# Altium footprint library KwantLib.PcbLib: 249 footprints (part 9 of 16)
Each footprint in its own frame and in the unit in brackets; x right, y up, seen from the top. Pads: shape width x height; smd on the part's side, far side on the other; paste and mask are expansions set on the pad; w line width, h text height; cw(c..) or ccw(c..) is an arc to the next point about the centre after c.
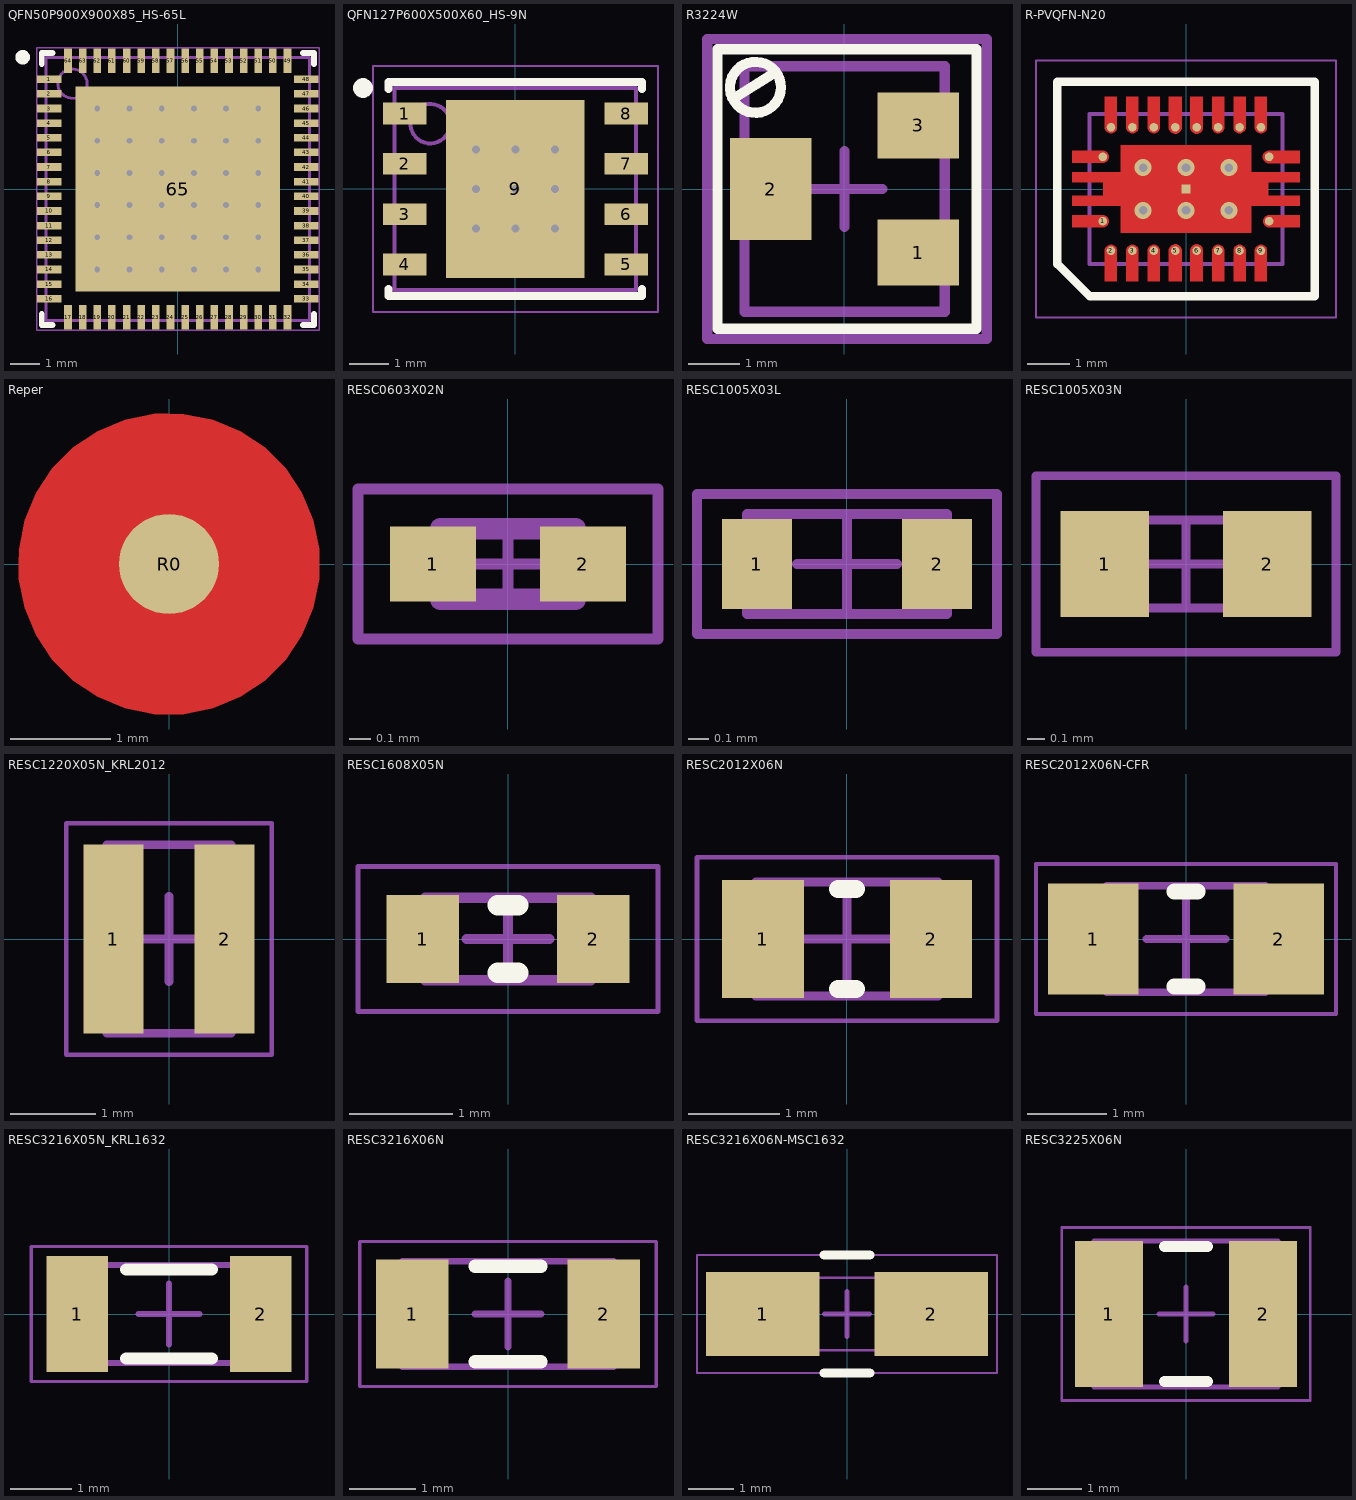
[diagram p8: the footprints below, top view; thin cyan lines are the x and y axes]

## QFN50P900X900X85_HS-65L [mm] "QFN, 64-Leads, Body 9.00x9.00mm, Pitch 0.50mm, Thermal Pad 6.90x6.90mm, IPC High Density"
height 0.85
pads (65):
  rect 0.84x0.26 smd mask+0.07: 1(-4.385,3.75) 2(-4.385,3.25) 3(-4.385,2.75) 4(-4.385,2.25) 5(-4.385,1.75) 6(-4.385,1.25) 7(-4.385,0.75) 8(-4.385,0.25) 9(-4.385,-0.25) 10(-4.385,-0.75) 11(-4.385,-1.25) 12(-4.385,-1.75) 13(-4.385,-2.25) 14(-4.385,-2.75) 15(-4.385,-3.25) 16(-4.385,-3.75) 33(4.385,-3.75) 34(4.385,-3.25) 35(4.385,-2.75) 36(4.385,-2.25) 37(4.385,-1.75) 38(4.385,-1.25) 39(4.385,-0.75) 40(4.385,-0.25) 41(4.385,0.25) 42(4.385,0.75) 43(4.385,1.25) 44(4.385,1.75) 45(4.385,2.25) 46(4.385,2.75) 47(4.385,3.25) 48(4.385,3.75)
  rect 0.26x0.84 smd mask+0.07: 17(-3.75,-4.385) 18(-3.25,-4.385) 19(-2.75,-4.385) 20(-2.25,-4.385) 21(-1.75,-4.385) 22(-1.25,-4.385) 23(-0.75,-4.385) 24(-0.25,-4.385) 25(0.25,-4.385) 26(0.75,-4.385) 27(1.25,-4.385) 28(1.75,-4.385) 29(2.25,-4.385) 30(2.75,-4.385) 31(3.25,-4.385) 32(3.75,-4.385) 49(3.75,4.385) 50(3.25,4.385) 51(2.75,4.385) 52(2.25,4.385) 53(1.75,4.385) 54(1.25,4.385) 55(0.75,4.385) 56(0.25,4.385) 57(-0.25,4.385) 58(-0.75,4.385) 59(-1.25,4.385) 60(-1.75,4.385) 61(-2.25,4.385) 62(-2.75,4.385) 63(-3.25,4.385) 64(-3.75,4.385)
  rect 7x7 smd mask+0.07: 65(0,0)
via -2.75,2.75 diameter 0.5 hole 0.2
via -1.65,2.75 diameter 0.5 hole 0.2
via -0.55,2.75 diameter 0.5 hole 0.2
via 0.55,2.75 diameter 0.5 hole 0.2
via 1.65,2.75 diameter 0.5 hole 0.2
via 2.75,2.75 diameter 0.5 hole 0.2
via -2.75,1.65 diameter 0.5 hole 0.2
via -1.65,1.65 diameter 0.5 hole 0.2
via -0.55,1.65 diameter 0.5 hole 0.2
via 0.55,1.65 diameter 0.5 hole 0.2
via 1.65,1.65 diameter 0.5 hole 0.2
via 2.75,1.65 diameter 0.5 hole 0.2
via -2.75,0.55 diameter 0.5 hole 0.2
via -1.65,0.55 diameter 0.5 hole 0.2
via -0.55,0.55 diameter 0.5 hole 0.2
via 0.55,0.55 diameter 0.5 hole 0.2
via 1.65,0.55 diameter 0.5 hole 0.2
via 2.75,0.55 diameter 0.5 hole 0.2
via -2.75,-0.55 diameter 0.5 hole 0.2
via -1.65,-0.55 diameter 0.5 hole 0.2
via -0.55,-0.55 diameter 0.5 hole 0.2
via 0.55,-0.55 diameter 0.5 hole 0.2
via 1.65,-0.55 diameter 0.5 hole 0.2
via 2.75,-0.55 diameter 0.5 hole 0.2
via -2.75,-1.65 diameter 0.5 hole 0.2
via -1.65,-1.65 diameter 0.5 hole 0.2
via -0.55,-1.65 diameter 0.5 hole 0.2
via 0.55,-1.65 diameter 0.5 hole 0.2
via 1.65,-1.65 diameter 0.5 hole 0.2
via 2.75,-1.65 diameter 0.5 hole 0.2
via -2.75,-2.75 diameter 0.5 hole 0.2
via -1.65,-2.75 diameter 0.5 hole 0.2
via -0.55,-2.75 diameter 0.5 hole 0.2
via 0.55,-2.75 diameter 0.5 hole 0.2
via 1.65,-2.75 diameter 0.5 hole 0.2
via 2.75,-2.75 diameter 0.5 hole 0.2
Top Overlay:
  circle w0.25: c-5.3,4.5 r0.125
  lines w0.2: -4.65,-4.275 -4.65,-4.65 -4.275,-4.65 ; -4.65,4.275 -4.65,4.65 -4.275,4.65 ; 4.275,-4.65 4.65,-4.65 4.65,-4.275 ; 4.275,4.65 4.65,4.65 4.65,4.275
Mechanical 13:
  circle w0.1: c-3.6,3.6 r0.5
  lines w0.1: -4.5,-4.5 -4.5,4.5 4.5,4.5 4.5,-4.5 -4.5,-4.5
Mechanical 15:
  lines w0.05: -4.825,-4.825 -4.825,4.825 4.825,4.825 4.825,-4.825 -4.825,-4.825
  lines w0.1: -0.5,0 0.5,0 ; 0,-0.5 0,0.5
3D body "QFN50P900X900X85_HS-65L.step": height 0.85, standoff 0, extent -4.52,-4.52 4.52,4.52

## QFN127P600X500X60_HS-9N [mm] "QFN, 8-Leads, Body 6.00x5.00mm, Pitch 1.27mm, Thermal Pad 3.40x4.00mm, IPC Medium Density"
height 0.6
pads (9):
  rect 1.1x0.55 smd paste-0.05 mask+0.07: 1(-2.8,1.905) 2(-2.8,0.635) 3(-2.8,-0.635) 4(-2.8,-1.905) 5(2.8,-1.905) 6(2.8,-0.635) 7(2.8,0.635) 8(2.8,1.905)
  rect 3.5x4.5 smd paste-5 mask+0.07: 9(0,0)
via -1,-1 diameter 0.4 hole 0.2
via 0,-1 diameter 0.4 hole 0.2
via 1,-1 diameter 0.4 hole 0.2
via 1,1 diameter 0.4 hole 0.2
via -1,1 diameter 0.4 hole 0.2
via 0,1 diameter 0.4 hole 0.2
via -1,0 diameter 0.4 hole 0.2
via 1,0 diameter 0.4 hole 0.2
via 0,0 diameter 0.4 hole 0.2
Top Overlay:
  circle w0.25: c-3.85,2.55 r0.125
  lines w0.2: -3.2,-2.53 -3.2,-2.7 0.01,-2.7 ; -3.2,2.53 -3.2,2.7 0.01,2.7 ; -0.01,-2.7 3.2,-2.7 3.2,-2.53 ; -0.01,2.7 3.2,2.7 3.2,2.53
Top Paste:
  region: -1.575,0.175 -0.175,0.175 -0.175,2.075 -1.575,2.075
  region: 0.175,0.175 1.575,0.175 1.575,2.075 0.175,2.075
  region: -1.575,-2.075 -0.175,-2.075 -0.175,-0.175 -1.575,-0.175
  region: 0.175,-2.075 1.575,-2.075 1.575,-0.175 0.175,-0.175
Mechanical 13:
  circle w0.1: c-2.15,1.65 r0.5
  lines w0.1: -3.05,-2.55 -3.05,2.55 3.05,2.55 3.05,-2.55 -3.05,-2.55
Mechanical 15:
  lines w0.05: -3.6,-3.1 -3.6,3.1 3.6,3.1 3.6,-3.1 -3.6,-3.1
  lines w0.1: -0.5,0 0.5,0 ; 0,-0.5 0,0.5
3D body "QFN127P600X500X60_HS-9N.step": height 0.6, standoff 0, extent -3.06,-2.55 3.06,2.55

## R3224W [mm] "Подстроечный резистор"
height 5.3
pads (3):
  rect 1.6x1.3 smd mask+0.07: 1(1.45,-1.25) 3(1.45,1.25)
  rect 1.6x2 smd mask+0.07: 2(-1.45,0)
Top Overlay:
  circle w0.2: c-1.75,2 r0.501
  lines w0.2: -2.189,1.773 -1.35,2.3 ; -2.5,-2.75 2.6,-2.75 2.6,2.75 -2.5,2.75 -2.5,-2.75
Mechanical 13:
  lines w0.2: -1.965,-2.413 -1.965,2.413 1.973,2.413 1.973,-2.413 -1.965,-2.413
Mechanical 15:
  lines w0.2: -0.75,0 0.75,0 ; 0,-0.75 0,0.75 ; -2.7,-2.95 2.8,-2.95 2.8,2.95 -2.7,2.95 -2.7,-2.95
3D body "R3224W.stp": height 5.28, standoff 0, extent -1.965,-2.413 1.973,2.413

## R-PVQFN-N20 [mm]
height 1
pads (21):
  round 0.2 smd paste-1 mask+0: 1(-1.94,-0.75) 2(-1.75,-1.44) 3(-1.25,-1.44) 4(-0.75,-1.44) 5(-0.25,-1.44) 6(0.25,-1.44) 7(0.75,-1.44) 8(1.25,-1.44) 9(1.75,-1.44) 10(1.94,-0.75) 11(1.94,0.75) 12(1.75,1.44) 13(1.25,1.44) 14(0.75,1.44) 15(0.25,1.44) 16(-0.25,1.44) 17(-0.75,1.44) 18(-1.25,1.44) 19(-1.75,1.44) 20(-1.94,0.75)
  rect 0.2x0.2 smd paste-1: 21(0,0)
via 1,0.5 diameter 0.4 hole 0.2
via 1,-0.5 diameter 0.4 hole 0.2
via -1,0.5 diameter 0.4 hole 0.2
via 0,-0.5 diameter 0.4 hole 0.2
via 0,0.5 diameter 0.4 hole 0.2
via -1,-0.5 diameter 0.4 hole 0.2
Top Layer:
  region: -2.65,-0.16 -1.925,-0.16 -1.925,0.16 -2.65,0.16 -2.65,0.39 -1.525,0.39 -1.525,1.025 1.525,1.025 1.525,0.39 2.65,0.39 2.65,0.16 1.925,0.16 1.925,-0.16 2.65,-0.16 2.65,-0.39 1.525,-0.39 1.525,-1.025 -1.525,-1.025 -1.525,-0.39 -2.65,-0.39
  region: 1.61,-2.15 1.61,-1.44 1.61,-1.412 1.631,-1.361 1.671,-1.321 1.722,-1.3 1.75,-1.3 1.778,-1.3 1.829,-1.321 1.869,-1.361 1.89,-1.412 1.89,-1.44 1.89,-2.15
  region: 1.11,-2.15 1.11,-1.44 1.11,-1.412 1.131,-1.361 1.171,-1.321 1.222,-1.3 1.25,-1.3 1.278,-1.3 1.329,-1.321 1.369,-1.361 1.39,-1.412 1.39,-1.44 1.39,-2.15
  region: 0.61,-2.15 0.89,-2.15 0.89,-1.44 0.89,-1.412 0.869,-1.361 0.829,-1.321 0.778,-1.3 0.75,-1.3 0.722,-1.3 0.671,-1.321 0.631,-1.361 0.61,-1.412 0.61,-1.44
  region: 0.103,-2.15 0.103,-2.151 0.104,-2.154 0.106,-2.156 0.109,-2.157 0.11,-2.157 0.39,-2.157 0.391,-2.157 0.394,-2.156 0.396,-2.154 0.397,-2.151 0.397,-2.15 0.397,-1.44 0.397,-1.411 0.374,-1.357 0.333,-1.316 0.279,-1.293 0.25,-1.293 0.221,-1.293 0.167,-1.316 0.126,-1.357 0.103,-1.411 0.103,-1.44
  region: -0.397,-2.15 -0.397,-2.151 -0.396,-2.154 -0.394,-2.156 -0.391,-2.157 -0.39,-2.157 -0.11,-2.157 -0.109,-2.157 -0.106,-2.156 -0.104,-2.154 -0.103,-2.151 -0.103,-2.15 -0.103,-1.44 -0.103,-1.411 -0.126,-1.357 -0.167,-1.316 -0.221,-1.293 -0.25,-1.293 -0.279,-1.293 -0.333,-1.316 -0.374,-1.357 -0.397,-1.411 -0.397,-1.44
  region: -0.89,-2.15 -0.61,-2.15 -0.61,-1.44 -0.61,-1.412 -0.631,-1.361 -0.671,-1.321 -0.722,-1.3 -0.75,-1.3 -0.778,-1.3 -0.829,-1.321 -0.869,-1.361 -0.89,-1.412 -0.89,-1.44
  region: -1.39,-2.15 -1.11,-2.15 -1.11,-1.44 -1.11,-1.412 -1.131,-1.361 -1.171,-1.321 -1.222,-1.3 -1.25,-1.3 -1.278,-1.3 -1.329,-1.321 -1.369,-1.361 -1.39,-1.412 -1.39,-1.44
  region: -1.89,-2.15 -1.61,-2.15 -1.61,-1.44 -1.61,-1.412 -1.631,-1.361 -1.671,-1.321 -1.722,-1.3 -1.75,-1.3 -1.778,-1.3 -1.829,-1.321 -1.869,-1.361 -1.89,-1.412 -1.89,-1.44
  region: -2.65,-0.89 -2.65,-0.61 -1.94,-0.61 -1.912,-0.61 -1.861,-0.631 -1.821,-0.671 -1.8,-0.722 -1.8,-0.75 -1.8,-0.778 -1.821,-0.829 -1.861,-0.869 -1.912,-0.89 -1.94,-0.89
  region: 1.8,-0.75 1.8,-0.778 1.821,-0.829 1.861,-0.869 1.912,-0.89 1.94,-0.89 2.65,-0.89 2.65,-0.61 1.94,-0.61 1.912,-0.61 1.861,-0.631 1.821,-0.671 1.8,-0.722
  region: 1.94,0.603 1.911,0.603 1.857,0.626 1.815,0.667 1.793,0.721 1.793,0.75 1.793,0.779 1.816,0.833 1.857,0.874 1.911,0.897 1.94,0.897 2.65,0.897 2.651,0.897 2.654,0.896 2.656,0.894 2.657,0.891 2.657,0.89 2.657,0.61 2.657,0.609 2.656,0.606 2.654,0.604 2.651,0.603 2.65,0.603
  region: 1.61,1.44 1.61,1.412 1.631,1.361 1.671,1.321 1.722,1.3 1.75,1.3 1.778,1.3 1.829,1.321 1.869,1.361 1.89,1.412 1.89,1.44 1.89,2.15 1.61,2.15
  region: 1.25,1.3 1.222,1.3 1.171,1.321 1.131,1.361 1.11,1.412 1.11,1.44 1.11,2.15 1.39,2.15 1.39,1.44 1.39,1.412 1.369,1.361 1.329,1.321 1.278,1.3
  region: 0.61,1.44 0.61,2.15 0.89,2.15 0.89,1.44 0.89,1.412 0.869,1.361 0.829,1.321 0.778,1.3 0.75,1.3 0.722,1.3 0.671,1.321 0.631,1.361 0.61,1.412
  region: 0.25,1.293 0.221,1.293 0.167,1.316 0.126,1.357 0.103,1.411 0.103,1.44 0.103,2.15 0.103,2.151 0.104,2.154 0.106,2.156 0.109,2.157 0.11,2.157 0.39,2.157 0.391,2.157 0.394,2.156 0.396,2.154 0.397,2.151 0.397,2.15 0.397,1.44 0.397,1.411 0.374,1.357 0.333,1.316 0.279,1.293
  region: -0.25,1.293 -0.279,1.293 -0.333,1.316 -0.374,1.357 -0.397,1.411 -0.397,1.44 -0.397,2.15 -0.397,2.151 -0.396,2.154 -0.394,2.156 -0.391,2.157 -0.39,2.157 -0.11,2.157 -0.109,2.157 -0.106,2.156 -0.104,2.154 -0.103,2.151 -0.103,2.15 -0.103,1.44 -0.103,1.411 -0.126,1.357 -0.167,1.316 -0.221,1.293
  region: -0.75,1.3 -0.778,1.3 -0.829,1.321 -0.869,1.361 -0.89,1.412 -0.89,1.44 -0.89,2.15 -0.61,2.15 -0.61,1.44 -0.61,1.412 -0.631,1.361 -0.671,1.321 -0.722,1.3
  region: -1.25,1.3 -1.278,1.3 -1.329,1.321 -1.369,1.361 -1.39,1.412 -1.39,1.44 -1.39,2.15 -1.11,2.15 -1.11,1.44 -1.11,1.412 -1.131,1.361 -1.171,1.321 -1.222,1.3
  region: -1.75,1.3 -1.778,1.3 -1.829,1.321 -1.869,1.361 -1.89,1.412 -1.89,1.44 -1.89,2.15 -1.61,2.15 -1.61,1.44 -1.61,1.412 -1.631,1.361 -1.671,1.321 -1.722,1.3
  region: -2.65,0.61 -2.65,0.89 -1.94,0.89 -1.912,0.89 -1.861,0.869 -1.821,0.829 -1.8,0.778 -1.8,0.75 -1.8,0.722 -1.821,0.671 -1.861,0.631 -1.912,0.61 -1.94,0.61
Top Overlay:
  lines w0.2: -3,-1.75 -2.25,-2.5 3,-2.5 3,0.75 3,2.5 -3,2.5 -3,-1.75
Top Paste:
  region: 1.725,-0.39 1.725,-0.16 2.625,-0.16 2.625,-0.39
  region: 1.725,0.16 2.625,0.16 2.625,0.39 1.725,0.39
  region: 0.15,0.15 0.15,0.97 1.47,0.97 1.47,0.15
  region: 0.15,-0.97 0.15,-0.15 1.47,-0.15 1.47,-0.97
  region: -1.47,-0.97 -1.47,-0.15 -0.15,-0.15 -0.15,-0.97
  region: -1.47,0.15 -1.47,0.97 -0.15,0.97 -0.15,0.15
  region: -2.625,-0.39 -2.625,-0.16 -1.725,-0.16 -1.725,-0.39
  region: -2.625,0.16 -1.725,0.16 -1.725,0.39 -2.625,0.39
Mechanical 13:
  lines w0.1: -2.25,-1.75 2.25,-1.75 2.25,1.75 -2.25,1.75 -2.25,-1.75
Mechanical 15:
  lines w0.05: -1,0 1,0 ; 0,-1 0,1 ; -3.5,-3 3.5,-3 3.5,3 -3.5,3 -3.5,-3
3D body: height 1, standoff 0.01, extent -2.25,-1.75 2.25,1.75

## Reper [mm] "Опорная точка"
pads (1):
  round 1 smd paste-2 mask+1: R0(0,0)
Top Layer:
  pour cut-out: 0,-1.5 -0.148,-1.5 -0.438,-1.442 -0.711,-1.329 -0.956,-1.165 -1.165,-0.956 -1.329,-0.711 -1.442,-0.438 -1.5,-0.148 -1.5,0 -1.5,0.148 -1.442,0.438 -1.329,0.711 -1.165,0.956 -0.956,1.165 -0.711,1.329 -0.438,1.442 -0.148,1.5 0,1.5 0.148,1.5 0.438,1.442 0.711,1.329 0.956,1.165 1.165,0.956 1.329,0.711 1.442,0.438 1.5,0.148 1.5,0 1.5,-0.148 1.442,-0.438 1.329,-0.711 1.165,-0.956 0.956,-1.165 0.711,-1.329 0.438,-1.442 0.148,-1.5

## RESC0603X02N [mm] "Chip Resistor, 2-Leads, Body 0.60x0.30mm, IPC Medium Density"
height 0.23
pads (2):
  rect 0.4x0.35 smd paste-1: 1(-0.35,0) 2(0.35,0)
Top Paste:
  region: -0.45,-0.15 -0.46,-0.15 -0.478,-0.142 -0.492,-0.128 -0.5,-0.11 -0.5,-0.1 -0.5,0.1 -0.5,0.11 -0.492,0.128 -0.478,0.142 -0.46,0.15 -0.45,0.15 -0.225,0.15 -0.215,0.15 -0.197,0.142 -0.183,0.128 -0.175,0.11 -0.175,0.1 -0.175,-0.1 -0.175,-0.11 -0.183,-0.128 -0.197,-0.142 -0.215,-0.15 -0.225,-0.15
  region: 0.45,0.15 0.46,0.15 0.478,0.142 0.492,0.128 0.5,0.11 0.5,0.1 0.5,-0.1 0.5,-0.11 0.492,-0.128 0.478,-0.142 0.46,-0.15 0.45,-0.15 0.225,-0.15 0.215,-0.15 0.197,-0.142 0.183,-0.128 0.175,-0.11 0.175,-0.1 0.175,0.1 0.175,0.11 0.183,0.128 0.197,0.142 0.215,0.15 0.225,0.15
Mechanical 13:
  lines w0.1: -0.315,-0.165 -0.315,0.165 0.315,0.165 0.315,-0.165 -0.315,-0.165
Mechanical 15:
  lines w0.05: -0.165,0 0.165,0 ; 0,-0.165 0,0.165 ; -0.7,-0.35 -0.7,0.35 0.7,0.35 0.7,-0.35 -0.7,-0.35
3D body "RESC0603X02N.step": height 0.23, standoff 0, extent -0.315,-0.165 0.315,0.165

## RESC1005X03L [mm] "Chip Resistor, 2-Leads, Body 1.00x0.50mm, IPC High Density"
height 0.35
pads (2):
  rect 0.35x0.45 smd mask+0.07: 1(-0.45,0) 2(0.45,0)
Mechanical 13:
  lines w0.05: -0.5,-0.25 -0.5,0.25 0.5,0.25 0.5,-0.25 -0.5,-0.25
Mechanical 15:
  lines w0.05: -0.25,0 0.25,0 ; 0,-0.25 0,0.25 ; -0.75,-0.35 -0.75,0.35 0.75,0.35 0.75,-0.35 -0.75,-0.35
3D body "RESC1005X03L.step": height 0.35, standoff 0, extent -0.5,-0.25 0.5,0.25

## RESC1005X03N [mm] "Chip Resistor, 2-Leads, Body 1.00x0.50mm, IPC Medium Density"
height 0.35
pads (2):
  rect 0.5x0.6 smd paste-0.03 mask+0.07: 1(-0.46,0) 2(0.46,0)
Mechanical 13:
  lines w0.05: -0.5,-0.25 -0.5,0.25 0.5,0.25 0.5,-0.25 -0.5,-0.25
Mechanical 15:
  lines w0.05: -0.25,0 0.25,0 ; 0,-0.25 0,0.25 ; -0.85,-0.5 -0.85,0.5 0.85,0.5 0.85,-0.5 -0.85,-0.5
3D body "RESC1005X03L.step": height 0.35, standoff 0, extent -0.5,-0.25 0.5,0.25

## RESC1220X05N_KRL2012 [mm] "Chip Resistor, 2-Leads, Body 1.25x2.00mm, IPC Medium Density"
height 0.5
pads (2):
  rect 0.7x2.2 smd mask+0.07: 1(-0.65,0) 2(0.65,0)
Mechanical 13:
  lines w0.1: -0.725,-1.1 0.725,-1.1 0.725,1.1 -0.725,1.1 -0.725,-1.1
Mechanical 15:
  lines w0.05: -1.2,-1.35 1.2,-1.35 1.2,1.35 -1.2,1.35 -1.2,-1.35
  lines w0.1: -0.5,0 0.5,0 ; 0,-0.5 0,0.5
3D body "RESC1220X05N.step": height 0.5, standoff 0, extent -0.725,-1.1 0.725,1.1

## RESC1608X05N [mm] "Chip Resistor, 2-Leads, Body 1.60x0.80mm, IPC Medium Density"
height 0.45
pads (2):
  rect 0.7x0.85 smd paste-0.05: 1(-0.825,0) 2(0.825,0)
Top Overlay:
  lines w0.2: -0.1,-0.325 0.1,-0.325 ; -0.1,0.325 0.1,0.325
Mechanical 13:
  lines w0.1: -0.8,-0.4 0.8,-0.4 0.8,0.4 -0.8,0.4 -0.8,-0.4
Mechanical 15:
  lines w0.05: -1.45,-0.7 1.45,-0.7 1.45,0.7 -1.45,0.7 -1.45,-0.7
  lines w0.1: -0.4,0 0.4,0 ; 0,-0.4 0,0.4
3D body "RESC1608X05N.step": height 0.45, standoff 0, extent -0.8,-0.4 0.8,0.4

## RESC2012X06N [mm] "Chip Resistor, 2-Leads, Body 2.00x1.25mm, IPC Medium Density"
height 0.6
pads (2):
  rect 0.9x1.3 smd paste-0.05 mask+0.07: 1(-0.925,0) 2(0.925,0)
Top Overlay:
  lines w0.2: -0.1,-0.55 0.1,-0.55 ; -0.1,0.55 0.1,0.55
Mechanical 13:
  lines w0.1: -1,-0.625 1,-0.625 1,0.625 -1,0.625 -1,-0.625
Mechanical 15:
  lines w0.05: -1.65,-0.9 1.65,-0.9 1.65,0.9 -1.65,0.9 -1.65,-0.9
  lines w0.1: -0.5,0 0.5,0 ; 0,-0.5 0,0.5
3D body "RESC2012X06N.step": height 0.6, standoff 0, extent -1,-0.625 1,0.625

## RESC2012X06N-CFR [mm] "Chip Resistor, 2-Leads, Body 1.95x1.25mm, IPC Medium Density"
height 0.6
pads (2):
  rect 1.15x1.4 smd mask+0.07: 1(-1.175,0) 2(1.175,0)
Top Overlay:
  lines w0.2: -0.15,-0.6 0.15,-0.6 ; -0.15,0.6 0.15,0.6
Mechanical 13:
  lines w0.1: -1,-0.675 1,-0.675 1,0.675 -1,0.675 -1,-0.675
Mechanical 15:
  lines w0.05: -1.9,-0.95 1.9,-0.95 1.9,0.95 -1.9,0.95 -1.9,-0.95
  lines w0.1: -0.5,0 0.5,0 ; 0,-0.5 0,0.5
3D body "RESC2012X06N-CFR.step": height 0.6, standoff 0, extent -1,-0.675 1,0.675

## RESC3216X05N_KRL1632 [mm] "Chip Resistor, 2-Leads, Body 3.20x1.60mm, IPC Medium Density"
height 0.5
pads (2):
  rect 1x1.9 smd: 1(-1.5,0) 2(1.5,0)
Top Overlay:
  lines w0.2: -0.7,-0.725 0.7,-0.725 ; -0.7,0.725 0.7,0.725
Mechanical 13:
  lines w0.1: -1.6,-0.8 -1.6,0.8 1.6,0.8 1.6,-0.8 -1.6,-0.8
Mechanical 15:
  lines w0.05: -2.25,-1.1 -2.25,1.1 2.25,1.1 2.25,-1.1 -2.25,-1.1
  lines w0.1: -0.5,0 0.5,0 ; 0,-0.5 0,0.5
3D body "RESC3216X05N.step": height 0.5, standoff 0, extent -1.6,-0.8 1.6,0.8

## RESC3216X06N [mm] "Chip Resistor, 2-Leads, Body 3.20x1.60mm, IPC Medium Density"
height 0.6
pads (2):
  rect 1.1x1.65 smd: 1(-1.45,0) 2(1.45,0)
Top Overlay:
  lines w0.2: -0.5,-0.725 0.5,-0.725 ; -0.5,0.725 0.5,0.725
Mechanical 13:
  lines w0.1: -1.6,-0.8 -1.6,0.8 1.6,0.8 1.6,-0.8 -1.6,-0.8
Mechanical 15:
  lines w0.05: -2.25,-1.1 -2.25,1.1 2.25,1.1 2.25,-1.1 -2.25,-1.1
  lines w0.1: -0.5,0 0.5,0 ; 0,-0.5 0,0.5
3D body "RESC3216X06N.step": height 0.6, standoff 0, extent -1.6,-0.8 1.6,0.8

## RESC3216X06N-MSC1632 [mm] "Chip Resistor, 2-Leads, Body 3.20x1.60mm, IPC Medium Density"
height 0.6
pads (2):
  rect 2.5x1.84 smd paste-0.05 mask+0.03: 1(-1.85,0) 2(1.85,0)
Top Overlay:
  lines w0.2: -0.5,-1.3 0.5,-1.3 ; -0.5,1.3 0.5,1.3
Mechanical 13:
  lines w0.05: -1.6,-0.8 -1.6,0.8 1.6,0.8 1.6,-0.8 -1.6,-0.8
Mechanical 15:
  lines w0.05: -3.3,-1.3 3.3,-1.3 3.3,1.3 -3.3,1.3 -3.3,-1.3
  lines w0.1: -0.5,0 0.5,0 ; 0,-0.5 0,0.5
3D body "Resistor MCS.stp": height 0.6, standoff 0, extent -1.6,-0.8 1.6,0.8

## RESC3225X06N [mm] "Chip Resistor, 2-Leads, Body 3.20x2.50mm, IPC Medium Density"
height 0.6
pads (2):
  rect 1.25x2.7 smd: 1(-1.425,0) 2(1.425,0)
Top Overlay:
  lines w0.2: -0.4,-1.25 0.4,-1.25 ; -0.4,1.25 0.4,1.25
Mechanical 13:
  lines w0.1: -1.7,-1.35 -1.7,1.35 1.7,1.35 1.7,-1.35 -1.7,-1.35
Mechanical 15:
  lines w0.05: -2.3,-1.6 -2.3,1.6 2.3,1.6 2.3,-1.6 -2.3,-1.6
  lines w0.1: -0.5,0 0.5,0 ; 0,-0.5 0,0.5
3D body "RESC3225X06N.step": height 0.6, standoff 0, extent -1.7,-1.35 1.7,1.35